# Altium footprint library MyComponents_v2.5.PcbLib: 403 footprints (part 6 of 26)
Each footprint in its own frame and in the unit in brackets; x right, y up, seen from the top. Pads: shape width x height; smd on the part's side, far side on the other; paste and mask are expansions set on the pad; w line width, h text height; cw(c..) or ccw(c..) is an arc to the next point about the centre after c.
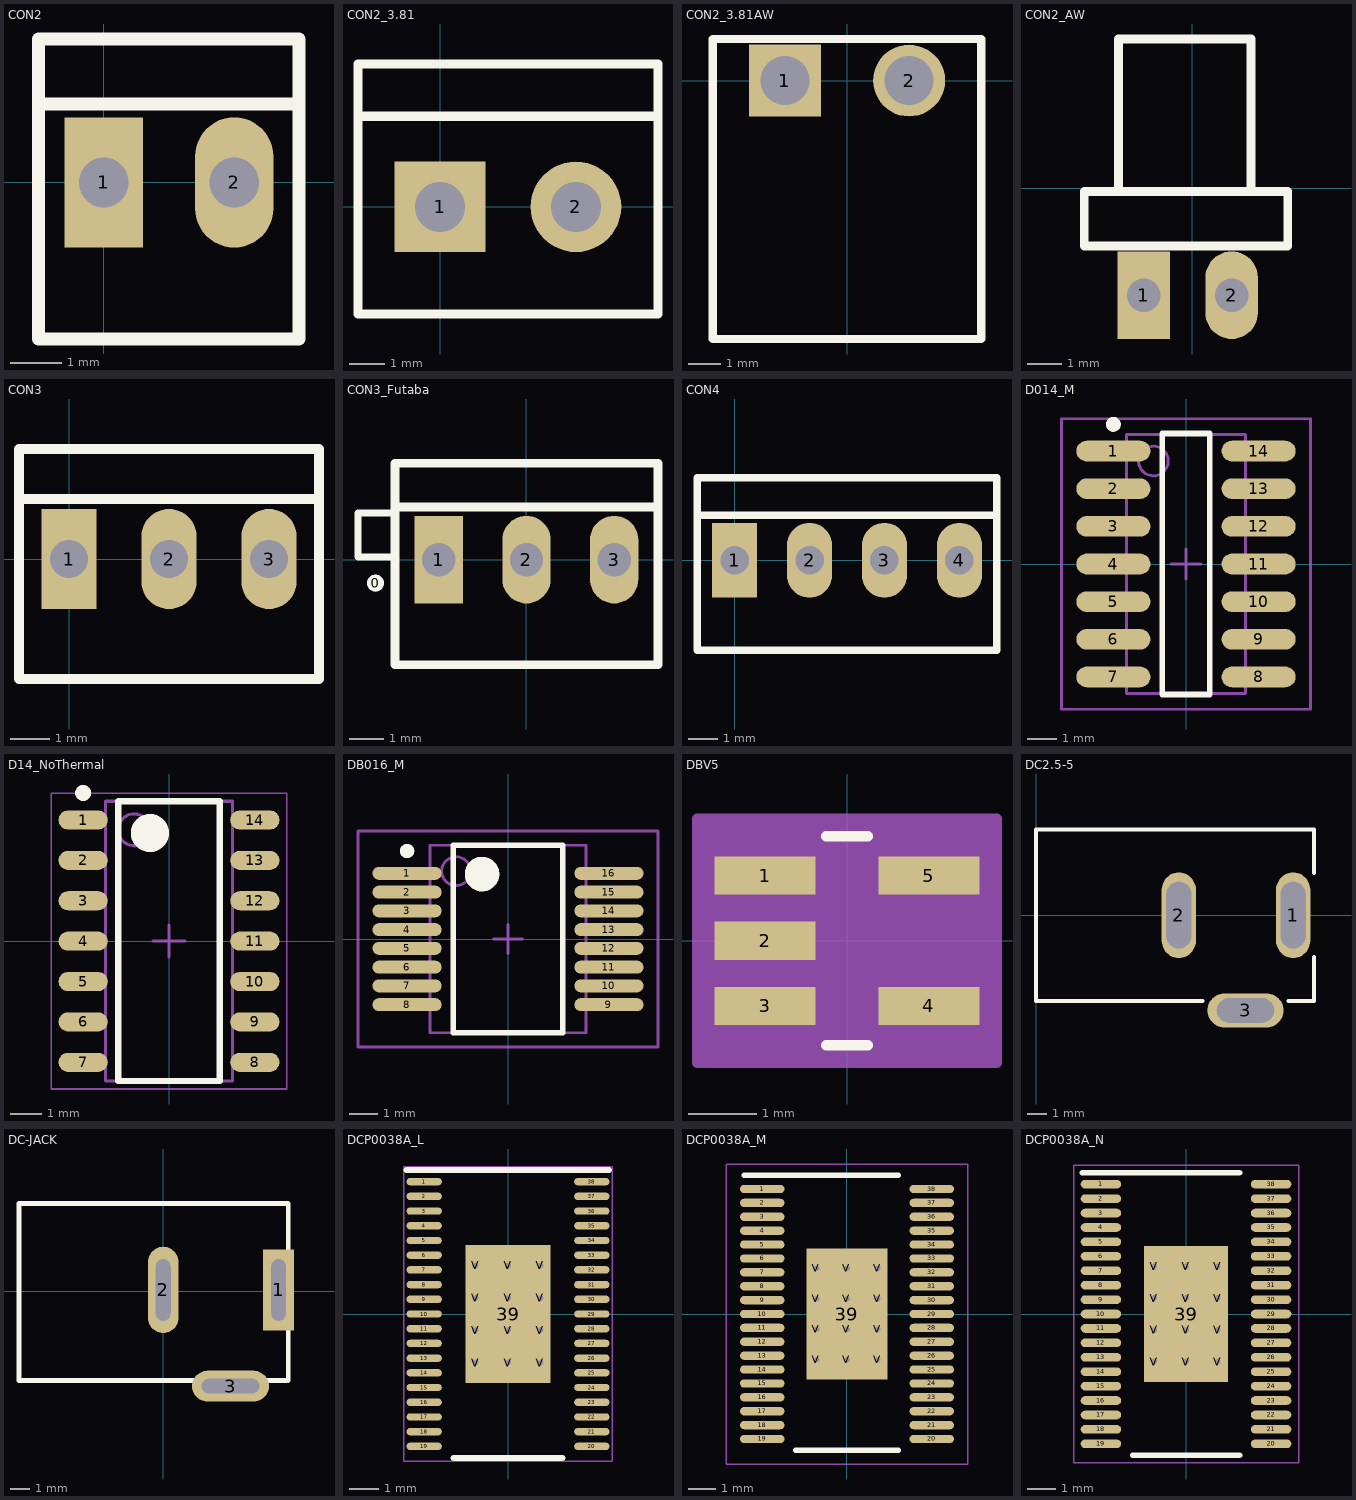
[diagram p5: the footprints below, top view; thin cyan lines are the x and y axes]

## CON2 [mil]
pads (2):
  rect 60x100 hole 38: 1(0,0)
  oval 60x100 hole 38: 2(100,0)
Top Overlay:
  lines w10: -50,60 149.61,60 ; -50,-120 149.61,-120 149.61,110 -50,110 -50,-120

## CON2_3.81 [mm]
pads (2):
  rect 2.54x2.54 hole 1.4: 1(0,0)
  round 2.54 hole 1.4: 2(3.81,0)
Top Overlay:
  lines w0.254: -2.286,2.54 6.096,2.54 ; -2.3,-3 6.11,-3 6.11,4 -2.3,4 -2.3,-3

## CON2_3.81AW [mm]
pads (2):
  rect 2.2x2.2 hole 1.5: 1(-1.9,0)
  round 2.2 hole 1.5: 2(1.9,0)
Top Overlay:
  lines w0.254: -4.1,-7.9 -4.1,1.27 4.1,1.27 4.1,-7.9 -4.1,-7.9

## CON2_AW [mil]
pads (2):
  rect 60x100 hole 38: 1(-55,-122)
  oval 60x100 hole 38: 2(45,-122)
Top Overlay:
  lines w10: -84,-2.63 -84,170 67,170 67,-2.63 ; -123,-66 109,-66 109,-4 -123,-4 -123,-66

## CON3 [mil]
pads (3):
  rect 55x100 hole 38: 1(0,0)
  oval 55x100 hole 38: 2(100,0) 3(200,0)
Top Overlay:
  lines w10: -50,60 250,60 ; 250,-120 -50,-120 -50,110 250,110 250,-118.35

## CON3_Futaba [mil]
pads (4):
  round 19.68 on Top Overlay: 0(-172.13,-26.85)
  rect 55x100 hole 38: 1(-100,0)
  oval 55x100 hole 38: 2(0,0) 3(100,0)
Top Overlay:
  lines w7.87: -155.12,53.15 -192.13,53.15 -192.13,3.15 -151.18,3.15
  lines w10: -150,60 150,60 ; 150,-120 -150,-120 -150,110 150,110 150,-118.35

## CON4 [mil]
pads (4):
  rect 60x100 hole 38: 1(0,0)
  oval 60x100 hole 38: 2(100,0) 3(200,0) 4(300,0)
Top Overlay:
  lines w10: -50,60 350,60 ; -50,-120 350,-120 350,110 -50,110 -50,-120

## D014_M [mm] "SOIC, 14-Leads, Body 8.7x3.9mm, Pitch 1.27mm, IPC Low Density"
height 1.75
pads (14):
  oval 2.5x0.7 smd: 1(-2.45,3.81) 2(-2.45,2.54) 3(-2.45,1.27) 4(-2.45,0) 5(-2.45,-1.27) 6(-2.45,-2.54) 7(-2.45,-3.81) 8(2.45,-3.81) 9(2.45,-2.54) 10(2.45,-1.27) 11(2.45,0) 12(2.45,1.27) 13(2.45,2.54) 14(2.45,3.81)
Top Overlay:
  circle w0.25: c-2.45,4.71 r0.125
  lines w0.2: -0.8,-4.4 0.8,-4.4 0.8,4.4 -0.8,4.4 -0.8,-4.4
Mechanical 13:
  circle w0.1: c-1.1,3.475 r0.5
  lines w0.1: -2,-4.375 2,-4.375 2,4.375 -2,4.375 -2,-4.375
Mechanical 15:
  lines w0.1: -0.5,0 0.5,0 ; 0,-0.5 0,0.5 ; -4.2,-4.9 4.2,-4.9 4.2,4.9 -4.2,4.9 -4.2,-4.9
3D body: height 1.75, standoff 0, extent -2,-4.375 2,4.375

## D14_NoThermal [mm] "SOIC, 14-Leads, Body 8.65x3.90mm, Pitch 1.27mm, IPC Medium Density"
height 1.75
pads (14):
  oval 1.55x0.6 smd: 1(-2.7,3.81) 2(-2.7,2.54) 3(-2.7,1.27) 4(-2.7,0) 5(-2.7,-1.27) 6(-2.7,-2.54) 7(-2.7,-3.81) 8(2.7,-3.81) 9(2.7,-2.54) 10(2.7,-1.27) 11(2.7,0) 12(2.7,1.27) 13(2.7,2.54) 14(2.7,3.81)
Top Overlay:
  circle w0.6: c-0.6,3.4 r0.3
  circle w0.25: c-2.7,4.66 r0.125
  lines w0.2: -1.6,-4.4 1.6,-4.4 1.6,4.4 -1.6,4.4 -1.6,-4.4
Mechanical 13:
  circle w0.1: c-1.1,3.5 r0.5
  lines w0.1: -2,-4.4 2,-4.4 2,4.4 -2,4.4 -2,-4.4
Mechanical 15:
  lines w0.05: -3.7,-4.65 3.7,-4.65 3.7,4.65 -3.7,4.65 -3.7,-4.65
  lines w0.1: -0.5,0 0.5,0 ; 0,-0.5 0,0.5
3D body: height 1.75, standoff 0.1, extent -2,-4.4 2,4.4

## DB016_M [mm] "SOP, 16-Leads, Body 6.2x5.3mm, Pitch 0.65mm, IPC Low Density"
height 2
pads (16):
  oval 2.4x0.45 smd: 1(-3.5,2.275) 2(-3.5,1.625) 3(-3.5,0.975) 4(-3.5,0.325) 5(-3.5,-0.325) 6(-3.5,-0.975) 7(-3.5,-1.625) 8(-3.5,-2.275) 9(3.5,-2.275) 10(3.5,-1.625) 11(3.5,-0.975) 12(3.5,-0.325) 13(3.5,0.325) 14(3.5,0.975) 15(3.5,1.625) 16(3.5,2.275)
Top Overlay:
  circle w0.25: c-3.5,3.05 r0.125
  circle w0.6: c-0.9,2.25 r0.3
  lines w0.2: -1.9,-3.25 -1.9,3.25 1.9,3.25 1.9,-3.25 -1.9,-3.25
Mechanical 13:
  circle w0.1: c-1.8,2.35 r0.5
  lines w0.1: -2.7,-3.25 -2.7,3.25 2.7,3.25 2.7,-3.25 -2.7,-3.25
Mechanical 15:
  lines w0.1: -0.5,0 0.5,0 ; 0,-0.5 0,0.5 ; -5.2,-3.75 -5.2,3.75 5.2,3.75 5.2,-3.75 -5.2,-3.75
3D body: height 2, standoff 0, extent -2.7,-3.25 2.7,3.25

## DBV5 [mil]
pads (5):
  rect 58x22 smd: 1(-47,37.4) 2(-47,0) 3(-47,-37.4) 4(47,-37.4) 5(47,37.4)
Top Overlay:
  lines w6: -11.91,-60 11.91,-60 ; -11.91,60 11.91,60
Mechanical 13:
  lines w0: -12,60 ccw(c0,60) 12,60
Mechanical 15:
  region: 86,-70 -86,-70 -86,70 86,70
  lines w6: -86,-70 -86,70 86,70 86,-70 -86,-70
3D body "DBV5.stp": height 57.1, standoff 0, extent -59,-60 59,60

## DC2.5-5 [mm] "DC Power Jack, 2.5mm, KLD Series, PCB Mount"
pads (3):
  oval 1.8x4.5 hole 1.3 slot 3.5 at 90 deg: 1(13.5,0) 2(7.5,0)
  oval 4x1.8 hole 1.3 slot 3 at 0 deg: 3(11,-5)
Top Overlay:
  lines w0.2: 8.75,-4.5 0,-4.5 0,4.5 14.6,4.5 14.6,2.2 ; 13.25,-4.5 14.6,-4.5 14.6,-2.2
Mechanical 1:
  lines w1: 9.5,-5 11.5,-5 ; 13.7,-1.25 13.7,1.25
3D body "DC5.5X2.5.step": height 10.4, standoff -4.2, extent -0.149,-5.283 14.351,4.267

## DC-JACK [mm] "DC Power Jack, 5.5mm-2.1mm"
pads (3):
  rect 1.6x4.2 hole 0.762 slot 3.2 at 90 deg: 1(6.007,0.072)
  oval 1.6x4.5 hole 0.762 slot 3.2 at 90 deg: 2(0.007,0.072)
  oval 4x1.6 hole 0.762 slot 3 at 0 deg: 3(3.507,-4.928)
Top Overlay:
  lines w0.254: -6.093,-4.628 6.407,-4.628 ; -6.093,4.572 -6.493,4.572 -7.493,4.572 -7.493,-4.428 -7.493,-4.628 -5.993,-4.628 ; -5.993,4.572 6.507,4.572 6.507,-4.628

## DCP0038A_L [mm]
pads (51):
  oval 1.2x0.25 smd paste+0 mask+0.051: 1(-2.85,4.5) 2(-2.85,4) 3(-2.85,3.5) 4(-2.85,3) 5(-2.85,2.5) 6(-2.85,2) 7(-2.85,1.5) 8(-2.85,1) 9(-2.85,0.5) 10(-2.85,0) 11(-2.85,-0.5) 12(-2.85,-1) 13(-2.85,-1.5) 14(-2.85,-2) 15(-2.85,-2.5) 16(-2.85,-3) 17(-2.85,-3.5) 18(-2.85,-4) 19(-2.85,-4.5) 20(2.85,-4.5) 21(2.85,-4) 22(2.85,-3.5) 23(2.85,-3) 24(2.85,-2.5) 25(2.85,-2) 26(2.85,-1.5) 27(2.85,-1) 28(2.85,-0.5) 29(2.85,0) 30(2.85,0.5) 31(2.85,1) 32(2.85,1.5) 33(2.85,2) 34(2.85,2.5) 35(2.85,3) 36(2.85,3.5) 37(2.85,4) 38(2.85,4.5)
  rect 2.9x4.7 smd paste+0 mask+0.051: 39(0,0)
  round 0.5 / inner round 1.524 / far side round 0.5 hole 0.203 mask+0.051: V(-1.1,-1.65) V(-1.1,-0.55) V(-1.1,0.55) V(-1.1,1.65) V(0,-1.65) V(0,-0.55) V(0,0.55) V(0,1.65) V(1.1,-1.65) V(1.1,-0.55) V(1.1,0.55) V(1.1,1.65)
Top Overlay:
  lines w0.2: -3.454,4.902 3.429,4.902 ; -1.85,-4.9 1.85,-4.9
Mechanical 15:
  lines w0.05: -3.55,-5 -3.55,5 3.55,5 3.55,-5 -3.55,-5
  lines w0.1: -0.5,0 0.5,0 ; 0,-0.5 0,0.5

## DCP0038A_M [mm]
pads (51):
  oval 1.6x0.3 smd paste+0 mask+0.051: 1(-3.05,4.5) 2(-3.05,4) 3(-3.05,3.5) 4(-3.05,3) 5(-3.05,2.5) 6(-3.05,2) 7(-3.05,1.5) 8(-3.05,1) 9(-3.05,0.5) 10(-3.05,0) 11(-3.05,-0.5) 12(-3.05,-1) 13(-3.05,-1.5) 14(-3.05,-2) 15(-3.05,-2.5) 16(-3.05,-3) 17(-3.05,-3.5) 18(-3.05,-4) 19(-3.05,-4.5) 20(3.05,-4.5) 21(3.05,-4) 22(3.05,-3.5) 23(3.05,-3) 24(3.05,-2.5) 25(3.05,-2) 26(3.05,-1.5) 27(3.05,-1) 28(3.05,-0.5) 29(3.05,0) 30(3.05,0.5) 31(3.05,1) 32(3.05,1.5) 33(3.05,2) 34(3.05,2.5) 35(3.05,3) 36(3.05,3.5) 37(3.05,4) 38(3.05,4.5)
  rect 2.9x4.7 smd paste+0 mask+0.051: 39(0,0)
  round 0.5 / inner round 1.524 / far side round 0.5 hole 0.203 mask+0.051: V(-1.1,-1.65) V(-1.1,-0.55) V(-1.1,0.55) V(-1.1,1.65) V(0,-1.65) V(0,-0.55) V(0,0.55) V(0,1.65) V(1.1,-1.65) V(1.1,-0.55) V(1.1,0.55) V(1.1,1.65)
Top Overlay:
  lines w0.2: -3.7,5 1.85,5 ; -1.85,-4.9 1.85,-4.9
Mechanical 15:
  lines w0.05: -4.35,-5.4 -4.35,5.4 4.35,5.4 4.35,-5.4 -4.35,-5.4
  lines w0.1: -0.5,0 0.5,0 ; 0,-0.5 0,0.5
3D body: height 0.25, standoff 0, extent 0,0 0.254,0.254

## DCP0038A_N [mm]
pads (51):
  oval 1.4x0.3 smd paste+0 mask+0.051: 1(-2.95,4.5) 2(-2.95,4) 3(-2.95,3.5) 4(-2.95,3) 5(-2.95,2.5) 6(-2.95,2) 7(-2.95,1.5) 8(-2.95,1) 9(-2.95,0.5) 10(-2.95,0) 11(-2.95,-0.5) 12(-2.95,-1) 13(-2.95,-1.5) 14(-2.95,-2) 15(-2.95,-2.5) 16(-2.95,-3) 17(-2.95,-3.5) 18(-2.95,-4) 19(-2.95,-4.5) 20(2.95,-4.5) 21(2.95,-4) 22(2.95,-3.5) 23(2.95,-3) 24(2.95,-2.5) 25(2.95,-2) 26(2.95,-1.5) 27(2.95,-1) 28(2.95,-0.5) 29(2.95,0) 30(2.95,0.5) 31(2.95,1) 32(2.95,1.5) 33(2.95,2) 34(2.95,2.5) 35(2.95,3) 36(2.95,3.5) 37(2.95,4) 38(2.95,4.5)
  rect 2.9x4.7 smd paste+0 mask+0.051: 39(0,0)
  round 0.5 / inner round 1.524 / far side round 0.5 hole 0.203 mask+0.051: V(-1.1,-1.65) V(-1.1,-0.55) V(-1.1,0.55) V(-1.1,1.65) V(0,-1.65) V(0,-0.55) V(0,0.55) V(0,1.65) V(1.1,-1.65) V(1.1,-0.55) V(1.1,0.55) V(1.1,1.65)
Top Overlay:
  lines w0.2: -3.6,4.9 1.85,4.9 ; -1.85,-4.9 1.85,-4.9
Mechanical 15:
  lines w0.05: -3.9,-5.15 3.9,-5.15 3.9,5.15 -3.9,5.15 -3.9,-5.15
  lines w0.1: -0.5,0 0.5,0 ; 0,-0.5 0,0.5
3D body: height 0.25, standoff 0, extent 0,0 0.254,0.254